# Altium footprint library 7-Connectors-11.PcbLib: 59 footprints (part 1 of 4)
Each footprint in its own frame and in the unit in brackets; x right, y up, seen from the top. Pads: shape width x height; smd on the part's side, far side on the other; paste and mask are expansions set on the pad; w line width, h text height; cw(c..) or ccw(c..) is an arc to the next point about the centre after c.
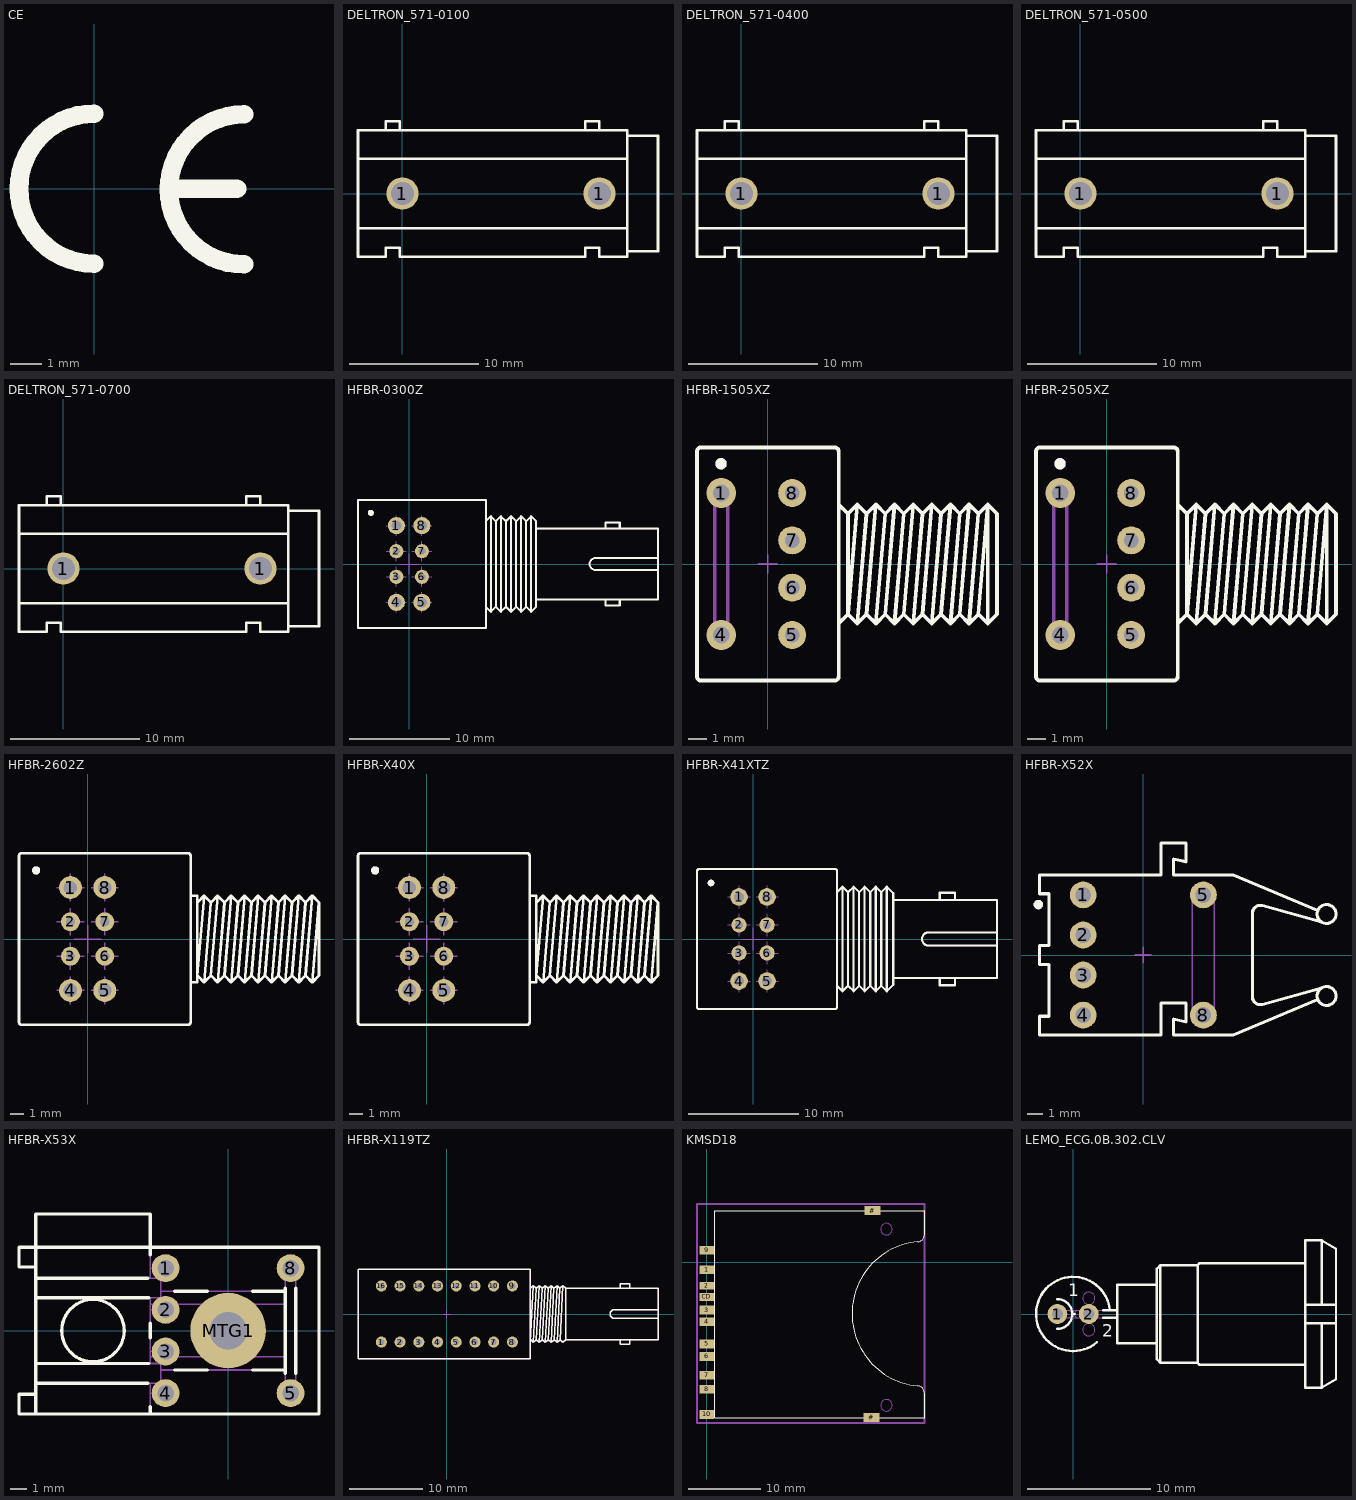
[diagram p0: the footprints below, top view; thin cyan lines are the x and y axes]

## CE [mm]
Top Overlay:
  lines w0.6: 0,-2.413 cw(c0,0) 0,2.413 ; 2.53,0 4.6,0 ; 4.826,-2.438 cw(c4.826,-0.025) 4.826,2.388
3D body "ce.stp": height 0.02, standoff 0, extent -2.725,-2.725 4.82,2.725

## DELTRON_571-0100 [mm] "Black Insulated ?4mm Angled Socket For Banana 4mm"
height 12.4
pads (2):
  round 2.5 hole 1.8: 1(0,0) 1(15.3,0)
Top Overlay:
  lines w0.2: -3.45,-2.7 17.45,-2.7 ; -3.45,2.7 17.45,2.7 ; -1.3,4.9 -1.3,5.6 -0.2,5.6 -0.2,4.9 ; 14.2,4.9 14.2,5.6 15.3,5.6 15.3,4.9 ; 17.45,-4.5 19.85,-4.5 19.85,4.5 17.45,4.5 ; -3.45,-4.9 -3.45,4.9 ; -3.45,-4.9 -1.3,-4.9 -1.3,-4.2 -0.2,-4.2 -0.2,-4.9 14.2,-4.9 14.2,-4.2 15.3,-4.2 15.3,-4.9 17.45,-4.9 17.45,4.9 -3.45,4.9 ; -3.45,-4.9 -3.45,4.9
Mechanical 8:
  lines w0.1: -0.5,0 0,0 ; 0,-0.5 0,0 ; 0,0.5 0,0 ; 0.5,0 0,0 ; 14.8,0 15.3,0 ; 15.3,-0.5 15.3,0 ; 15.3,0.5 15.3,0 ; 15.8,0 15.3,0
Mechanical 14:
  lines w0.1: -3.45,-2.7 17.45,-2.7 ; -3.45,2.7 17.45,2.7 ; -1.3,4.9 -1.3,5.6 -0.2,5.6 -0.2,4.9 ; 14.2,4.9 14.2,5.6 15.3,5.6 15.3,4.9 ; 17.45,-4.5 19.85,-4.5 19.85,4.5 17.45,4.5 ; -3.45,-4.9 -3.45,4.9 ; -3.45,-4.9 -1.3,-4.9 -1.3,-4.2 -0.2,-4.2 -0.2,-4.9 14.2,-4.9 14.2,-4.2 15.3,-4.2 15.3,-4.9 17.45,-4.9 17.45,4.9 -3.45,4.9 ; -3.45,-4.9 -3.45,4.9
3D body "DELTRON_571-0100.stp": height 12.4, standoff -3.8, extent -3.45,-4.9 19.85,5.6

## DELTRON_571-0400 [mm] "Green Insulated ?4mm Angled Socket For Banana 4mm"
height 12.4
pads (2):
  round 2.5 hole 1.8: 1(0,0) 1(15.3,0)
Top Overlay:
  lines w0.2: -3.45,-2.7 17.45,-2.7 ; -3.45,2.7 17.45,2.7 ; -1.3,4.9 -1.3,5.6 -0.2,5.6 -0.2,4.9 ; 14.2,4.9 14.2,5.6 15.3,5.6 15.3,4.9 ; 17.45,-4.5 19.85,-4.5 19.85,4.5 17.45,4.5 ; -3.45,-4.9 -3.45,4.9 ; -3.45,-4.9 -1.3,-4.9 -1.3,-4.2 -0.2,-4.2 -0.2,-4.9 14.2,-4.9 14.2,-4.2 15.3,-4.2 15.3,-4.9 17.45,-4.9 17.45,4.9 -3.45,4.9 ; -3.45,-4.9 -3.45,4.9
Mechanical 8:
  lines w0.1: -0.5,0 0,0 ; 0,-0.5 0,0 ; 0,0.5 0,0 ; 0.5,0 0,0 ; 14.8,0 15.3,0 ; 15.3,-0.5 15.3,0 ; 15.3,0.5 15.3,0 ; 15.8,0 15.3,0
Mechanical 14:
  lines w0.1: -3.45,-2.7 17.45,-2.7 ; -3.45,2.7 17.45,2.7 ; -1.3,4.9 -1.3,5.6 -0.2,5.6 -0.2,4.9 ; 14.2,4.9 14.2,5.6 15.3,5.6 15.3,4.9 ; 17.45,-4.5 19.85,-4.5 19.85,4.5 17.45,4.5 ; -3.45,-4.9 -3.45,4.9 ; -3.45,-4.9 -1.3,-4.9 -1.3,-4.2 -0.2,-4.2 -0.2,-4.9 14.2,-4.9 14.2,-4.2 15.3,-4.2 15.3,-4.9 17.45,-4.9 17.45,4.9 -3.45,4.9 ; -3.45,-4.9 -3.45,4.9
3D body "DELTRON_571-0400.stp": height 12.4, standoff -3.8, extent -3.45,-4.9 19.85,5.6

## DELTRON_571-0500 [mm] "Red Insulated ?4mm Angled Socket For Banana 4mm"
height 12.4
pads (2):
  round 2.5 hole 1.8: 1(0,0) 1(15.3,0)
Top Overlay:
  lines w0.2: -3.45,-2.7 17.45,-2.7 ; -3.45,2.7 17.45,2.7 ; -1.3,4.9 -1.3,5.6 -0.2,5.6 -0.2,4.9 ; 14.2,4.9 14.2,5.6 15.3,5.6 15.3,4.9 ; 17.45,-4.5 19.85,-4.5 19.85,4.5 17.45,4.5 ; -3.45,-4.9 -3.45,4.9 ; -3.45,-4.9 -1.3,-4.9 -1.3,-4.2 -0.2,-4.2 -0.2,-4.9 14.2,-4.9 14.2,-4.2 15.3,-4.2 15.3,-4.9 17.45,-4.9 17.45,4.9 -3.45,4.9 ; -3.45,-4.9 -3.45,4.9
Mechanical 8:
  lines w0.1: -0.5,0 0,0 ; 0,-0.5 0,0 ; 0,0.5 0,0 ; 0.5,0 0,0 ; 14.8,0 15.3,0 ; 15.3,-0.5 15.3,0 ; 15.3,0.5 15.3,0 ; 15.8,0 15.3,0
Mechanical 14:
  lines w0.1: -3.45,-2.7 17.45,-2.7 ; -3.45,2.7 17.45,2.7 ; -1.3,4.9 -1.3,5.6 -0.2,5.6 -0.2,4.9 ; 14.2,4.9 14.2,5.6 15.3,5.6 15.3,4.9 ; 17.45,-4.5 19.85,-4.5 19.85,4.5 17.45,4.5 ; -3.45,-4.9 -3.45,4.9 ; -3.45,-4.9 -1.3,-4.9 -1.3,-4.2 -0.2,-4.2 -0.2,-4.9 14.2,-4.9 14.2,-4.2 15.3,-4.2 15.3,-4.9 17.45,-4.9 17.45,4.9 -3.45,4.9 ; -3.45,-4.9 -3.45,4.9
3D body "DELTRON_571-0500.stp": height 12.4, standoff -3.8, extent -3.45,-4.9 19.85,5.6

## DELTRON_571-0700 [mm] "Yellow Insulated ?4mm Angled Socket For Banana 4mm"
height 12.4
pads (2):
  round 2.5 hole 1.8: 1(0,0) 1(15.3,0)
Top Overlay:
  lines w0.2: -3.45,-2.7 17.45,-2.7 ; -3.45,2.7 17.45,2.7 ; -1.3,4.9 -1.3,5.6 -0.2,5.6 -0.2,4.9 ; 14.2,4.9 14.2,5.6 15.3,5.6 15.3,4.9 ; 17.45,-4.5 19.85,-4.5 19.85,4.5 17.45,4.5 ; -3.45,-4.9 -3.45,4.9 ; -3.45,-4.9 -1.3,-4.9 -1.3,-4.2 -0.2,-4.2 -0.2,-4.9 14.2,-4.9 14.2,-4.2 15.3,-4.2 15.3,-4.9 17.45,-4.9 17.45,4.9 -3.45,4.9 ; -3.45,-4.9 -3.45,4.9
Mechanical 8:
  lines w0.1: -0.5,0 0,0 ; 0,-0.5 0,0 ; 0,0.5 0,0 ; 0.5,0 0,0 ; 14.8,0 15.3,0 ; 15.3,-0.5 15.3,0 ; 15.3,0.5 15.3,0 ; 15.8,0 15.3,0
Mechanical 14:
  lines w0.1: -3.45,-2.7 17.45,-2.7 ; -3.45,2.7 17.45,2.7 ; -1.3,4.9 -1.3,5.6 -0.2,5.6 -0.2,4.9 ; 14.2,4.9 14.2,5.6 15.3,5.6 15.3,4.9 ; 17.45,-4.5 19.85,-4.5 19.85,4.5 17.45,4.5 ; -3.45,-4.9 -3.45,4.9 ; -3.45,-4.9 -1.3,-4.9 -1.3,-4.2 -0.2,-4.2 -0.2,-4.9 14.2,-4.9 14.2,-4.2 15.3,-4.2 15.3,-4.9 17.45,-4.9 17.45,4.9 -3.45,4.9 ; -3.45,-4.9 -3.45,4.9
3D body "DELTRON_571-0700.stp": height 12.4, standoff -3.8, extent -3.45,-4.9 19.85,5.6

## HFBR-0300Z [mm] "HFBR-0300Z Series, Fiber Optic Transmitter or Receiver, Through Hole Mount"
height 10.2
pads (8):
  round 1.7 hole 1: 1(-1.27,3.81) 4(-1.27,-3.81) 5(1.27,-3.81) 8(1.27,3.81)
  round 1.4 hole 0.7: 2(-1.27,1.27) 3(-1.27,-1.27) 6(1.27,-1.27) 7(1.27,1.27)
Top Overlay:
  circle w0.3: c-3.81,5.08 r0.15
  lines w0.2: 7.62,-4.25 8.12,-4.75 ; 7.62,4.25 8.12,4.75 ; 12.62,-3.525 24.72,-3.525 ; 12.62,3.525 24.72,3.525 ; 19.52,-3.525 19.52,-4.1 20.92,-4.1 20.92,-3.525 ; 19.52,3.525 19.52,4.1 20.92,4.1 20.92,3.525 ; 24.72,-0.6 18.52,-0.6 cw(c18.52,0) 18.52,0.6 24.72,0.6 ; 8.12,-4.75 8.62,-4.25 ; 8.12,-4.75 8.12,4.75 ; 8.12,4.75 8.62,4.25 ; 8.62,-4.25 9.12,-4.75 ; 8.62,-4.25 8.62,4.25 ; 8.62,4.25 9.12,4.75 ; 9.12,-4.75 9.62,-4.25 ; 9.12,-4.75 9.12,4.75 ; 9.12,4.75 9.62,4.25 ; 9.62,-4.25 10.12,-4.75 ; 9.62,-4.25 9.62,4.25 ; 9.62,4.25 10.12,4.75 ; 10.12,-4.75 10.62,-4.25 ; 10.12,-4.75 10.12,4.75 ; 10.12,4.75 10.62,4.25 ; 10.62,-4.25 11.12,-4.75 ; 10.62,-4.25 10.62,4.25 ; 10.62,4.25 11.12,4.75 ; 11.12,-4.75 11.62,-4.25 ; 11.12,-4.75 11.12,4.75 ; 11.12,4.75 11.62,4.25 ; 11.62,-4.25 12.12,-4.75 ; 11.62,-4.25 11.62,4.25 ; 11.62,4.25 12.12,4.75 ; 12.12,-4.75 12.62,-4.25 12.62,4.25 12.12,4.75 ; 12.12,-4.75 12.12,4.75 ; 24.72,-3.525 24.72,3.525 ; 24.72,-3.525 24.72,3.525 ; -5.08,-6.35 -5.08,6.35 7.62,6.35 7.62,-6.35 -5.08,-6.35
Mechanical 8:
  lines w0.1: -2.27,-3.81 -1.27,-3.81 ; -2.27,-1.27 -1.27,-1.27 ; -2.27,1.27 -1.27,1.27 ; -2.27,3.81 -1.27,3.81 ; -1.27,-4.81 -1.27,-3.81 ; -1.27,-2.81 -1.27,-3.81 ; -1.27,-2.27 -1.27,-1.27 ; -1.27,-0.27 -1.27,-1.27 ; -1.27,0.27 -1.27,1.27 ; -1.27,2.27 -1.27,1.27 ; -1.27,2.81 -1.27,3.81 ; -1.27,4.81 -1.27,3.81 ; -1,0 0,0 ; -0.27,-3.81 -1.27,-3.81 ; -0.27,-1.27 -1.27,-1.27 ; -0.27,1.27 -1.27,1.27 ; -0.27,3.81 -1.27,3.81 ; 0,-1 0,0 ; 0,1 0,0 ; 0.27,-3.81 1.27,-3.81 ; 0.27,-1.27 1.27,-1.27 ; 0.27,1.27 1.27,1.27 ; 0.27,3.81 1.27,3.81 ; 1,0 0,0 ; 1.27,-4.81 1.27,-3.81 ; 1.27,-2.81 1.27,-3.81 ; 1.27,-2.27 1.27,-1.27 ; 1.27,-0.27 1.27,-1.27 ; 1.27,0.27 1.27,1.27 ; 1.27,2.27 1.27,1.27 ; 1.27,2.81 1.27,3.81 ; 1.27,4.81 1.27,3.81 ; 2.27,-3.81 1.27,-3.81 ; 2.27,-1.27 1.27,-1.27 ; 2.27,1.27 1.27,1.27 ; 2.27,3.81 1.27,3.81
Mechanical 14:
  circle w0.3: c-3.81,5.08 r0.15
  lines w0.1: 7.62,-4.25 8.12,-4.75 ; 7.62,4.25 8.12,4.75 ; 12.62,-3.525 24.72,-3.525 24.72,3.525 12.62,3.525 ; 19.52,-3.525 19.52,-4.1 20.92,-4.1 20.92,-3.525 ; 19.52,3.525 19.52,4.1 20.92,4.1 20.92,3.525 ; 24.72,-0.6 18.52,-0.6 cw(c18.52,0) 18.52,0.6 24.72,0.6 ; 8.12,-4.75 8.62,-4.25 ; 8.12,-4.75 8.12,4.75 ; 8.12,4.75 8.62,4.25 ; 8.62,-4.25 9.12,-4.75 ; 8.62,-4.25 8.62,4.25 ; 8.62,4.25 9.12,4.75 ; 9.12,-4.75 9.62,-4.25 ; 9.12,-4.75 9.12,4.75 ; 9.12,4.75 9.62,4.25 ; 9.62,-4.25 10.12,-4.75 ; 9.62,-4.25 9.62,4.25 ; 9.62,4.25 10.12,4.75 ; 10.12,-4.75 10.62,-4.25 ; 10.12,-4.75 10.12,4.75 ; 10.12,4.75 10.62,4.25 ; 10.62,-4.25 11.12,-4.75 ; 10.62,-4.25 10.62,4.25 ; 10.62,4.25 11.12,4.75 ; 11.12,-4.75 11.62,-4.25 ; 11.12,-4.75 11.12,4.75 ; 11.12,4.75 11.62,4.25 ; 11.62,-4.25 12.12,-4.75 ; 11.62,-4.25 11.62,4.25 ; 11.62,4.25 12.12,4.75 ; 12.12,-4.75 12.62,-4.25 12.62,4.25 12.12,4.75 ; 12.12,-4.75 12.12,4.75 ; -5.08,-6.15 ccw(c-4.88,-6.15) -4.88,-6.35 7.42,-6.35 ccw(c7.42,-6.15) 7.62,-6.15 7.62,6.15 ccw(c7.42,6.15) 7.42,6.35 -4.88,6.35 ccw(c-4.88,6.15) -5.08,6.15 -5.08,-6.15
3D body "HFBR-0300Z.stp": height 10.2, standoff -3.6, extent -5.08,-6.35 24.72,6.35

## HFBR-1505XZ [mm] "HFBR-1505xZ Series, SMA Plastic Housed, Fiber Optic Transmitter"
height 10.2
pads (6):
  round 1.6 hole 0.9: 1(-2.5,3.81) 4(-2.5,-3.81)
  round 1.5 hole 0.8: 5(1.31,-3.81) 6(1.31,-1.27) 7(1.31,1.27) 8(1.31,3.81)
Top Overlay:
  circle w0.3: c-2.51,5.38 r0.15
  lines w0.2: 3.8,-3.2 4.3,-2.7 ; 3.8,3.2 4.3,2.7 ; 4.3,-2.7 4.3,2.7 ; 4.3,-2.7 4.8,-3.2 ; 4.3,-2.7 4.8,3.2 ; 4.3,2.7 4.8,3.2 ; 4.8,-3.2 5.3,-2.7 ; 4.8,-3.2 5.3,2.7 ; 4.8,3.2 5.3,2.7 ; 5.3,-2.7 5.8,-3.2 ; 5.3,-2.7 5.8,3.2 ; 5.3,2.7 5.8,3.2 ; 5.8,-3.2 6.3,-2.7 ; 5.8,-3.2 6.3,2.7 ; 5.8,3.2 6.3,2.7 ; 6.3,-2.7 6.8,-3.2 ; 6.3,-2.7 6.8,3.2 ; 6.3,2.7 6.8,3.2 ; 6.8,-3.2 7.3,-2.7 ; 6.8,-3.2 7.3,2.7 ; 6.8,3.2 7.3,2.7 ; 7.3,-2.7 7.8,-3.2 ; 7.3,-2.7 7.8,3.2 ; 7.3,2.7 7.8,3.2 ; 7.8,-3.2 8.3,-2.7 ; 7.8,-3.2 8.3,2.7 ; 7.8,3.2 8.3,2.7 ; 8.3,-2.7 8.8,-3.2 ; 8.3,-2.7 8.8,3.2 ; 8.3,2.7 8.8,3.2 ; 8.8,-3.2 9.3,-2.7 ; 8.8,-3.2 9.3,2.7 ; 8.8,3.2 9.3,2.7 ; 9.3,-2.7 9.8,-3.2 ; 9.3,-2.7 9.8,3.2 ; 9.3,2.7 9.8,3.2 ; 9.8,-3.2 10.3,-2.7 ; 9.8,-3.2 10.3,2.7 ; 9.8,3.2 10.3,2.7 ; 10.3,-2.7 10.8,-3.2 ; 10.3,-2.7 10.8,3.2 ; 10.3,2.7 10.8,3.2 ; 10.8,-3.2 11.3,-2.7 ; 10.8,-3.2 11.3,2.7 ; 10.8,3.2 11.3,2.7 ; 11.3,-2.7 11.8,-3.2 ; 11.3,-2.7 11.8,3.2 ; 11.3,2.7 11.8,3.2 ; 11.8,-3.2 12.3,-2.7 12.3,2.7 11.8,3.2 ; 11.8,-3.2 11.8,3.2 ; -3.8,-6.05 ccw(c-3.6,-6.05) -3.6,-6.25 3.6,-6.25 ccw(c3.6,-6.05) 3.8,-6.05 3.8,6.05 ccw(c3.6,6.05) 3.6,6.25 -3.6,6.25 ccw(c-3.6,6.05) -3.8,6.05 -3.8,-6.05
Mechanical 8:
  lines w0.1: -3,-3.81 -2.5,-3.81 ; -3,3.81 -2.5,3.81 ; -2.5,-4.31 -2.5,-3.81 ; -2.5,-3.31 -2.5,-3.81 ; -2.5,3.31 -2.5,3.81 ; -2.5,4.31 -2.5,3.81 ; -2,-3.81 -2.5,-3.81 ; -2,3.81 -2.5,3.81 ; -0.5,0 0,0 ; 0,-0.5 0,0 ; 0,0.5 0,0 ; 0.5,0 0,0 ; 0.81,-3.81 1.31,-3.81 ; 0.81,-1.27 1.31,-1.27 ; 0.81,1.27 1.31,1.27 ; 0.81,3.81 1.31,3.81 ; 1.31,-4.31 1.31,-3.81 ; 1.31,-3.31 1.31,-3.81 ; 1.31,-1.77 1.31,-1.27 ; 1.31,-0.77 1.31,-1.27 ; 1.31,0.77 1.31,1.27 ; 1.31,1.77 1.31,1.27 ; 1.31,3.31 1.31,3.81 ; 1.31,4.31 1.31,3.81 ; 1.81,-3.81 1.31,-3.81 ; 1.81,-1.27 1.31,-1.27 ; 1.81,1.27 1.31,1.27 ; 1.81,3.81 1.31,3.81
Mechanical 14:
  circle w0.3: c-2.51,5.38 r0.15
  lines w0.1: 3.8,-3.2 4.3,-2.7 ; 3.8,3.2 4.3,2.7 ; 4.3,-2.7 4.3,2.7 ; 4.3,-2.7 4.8,-3.2 ; 4.3,-2.7 4.8,3.2 ; 4.3,2.7 4.8,3.2 ; 4.8,-3.2 5.3,-2.7 ; 4.8,-3.2 5.3,2.7 ; 4.8,3.2 5.3,2.7 ; 5.3,-2.7 5.8,-3.2 ; 5.3,-2.7 5.8,3.2 ; 5.3,2.7 5.8,3.2 ; 5.8,-3.2 6.3,-2.7 ; 5.8,-3.2 6.3,2.7 ; 5.8,3.2 6.3,2.7 ; 6.3,-2.7 6.8,-3.2 ; 6.3,-2.7 6.8,3.2 ; 6.3,2.7 6.8,3.2 ; 6.8,-3.2 7.3,-2.7 ; 6.8,-3.2 7.3,2.7 ; 6.8,3.2 7.3,2.7 ; 7.3,-2.7 7.8,-3.2 ; 7.3,-2.7 7.8,3.2 ; 7.3,2.7 7.8,3.2 ; 7.8,-3.2 8.3,-2.7 ; 7.8,-3.2 8.3,2.7 ; 7.8,3.2 8.3,2.7 ; 8.3,-2.7 8.8,-3.2 ; 8.3,-2.7 8.8,3.2 ; 8.3,2.7 8.8,3.2 ; 8.8,-3.2 9.3,-2.7 ; 8.8,-3.2 9.3,2.7 ; 8.8,3.2 9.3,2.7 ; 9.3,-2.7 9.8,-3.2 ; 9.3,-2.7 9.8,3.2 ; 9.3,2.7 9.8,3.2 ; 9.8,-3.2 10.3,-2.7 ; 9.8,-3.2 10.3,2.7 ; 9.8,3.2 10.3,2.7 ; 10.3,-2.7 10.8,-3.2 ; 10.3,-2.7 10.8,3.2 ; 10.3,2.7 10.8,3.2 ; 10.8,-3.2 11.3,-2.7 ; 10.8,-3.2 11.3,2.7 ; 10.8,3.2 11.3,2.7 ; 11.3,-2.7 11.8,-3.2 ; 11.3,-2.7 11.8,3.2 ; 11.3,2.7 11.8,3.2 ; 11.8,-3.2 12.3,-2.7 12.3,2.7 11.8,3.2 ; 11.8,-3.2 11.8,3.2 ; -3.8,-6.05 ccw(c-3.6,-6.05) -3.6,-6.25 3.6,-6.25 ccw(c3.6,-6.05) 3.8,-6.05 3.8,6.05 ccw(c3.6,6.05) 3.6,6.25 -3.6,6.25 ccw(c-3.6,6.05) -3.8,6.05 -3.8,-6.05 ; -2.9,-4.25 -2.9,4.25 -2.1,4.25 -2.1,-4.25 -2.9,-4.25 ; -2.8,-3.81 ccw(c-2.5,-3.81) -2.2,-3.81 -2.2,3.81 ccw(c-2.5,3.81) -2.8,3.81 -2.8,-3.81
3D body "HFBR-1505xZ.stp": height 10.2, standoff -2.8, extent -3.8,-6.249 12.3,6.249

## HFBR-2505XZ [mm] "HFBR-2505xZ Series, SMA Plastic Housed, Fiber Optic Receiver"
height 10.2
pads (6):
  round 1.6 hole 0.9: 1(-2.5,3.81) 4(-2.5,-3.81)
  round 1.5 hole 0.8: 5(1.31,-3.81) 6(1.31,-1.27) 7(1.31,1.27) 8(1.31,3.81)
Top Overlay:
  circle w0.3: c-2.51,5.38 r0.15
  lines w0.2: 3.8,-3.2 4.3,-2.7 ; 3.8,3.2 4.3,2.7 ; 4.3,-2.7 4.3,2.7 ; 4.3,-2.7 4.8,-3.2 ; 4.3,-2.7 4.8,3.2 ; 4.3,2.7 4.8,3.2 ; 4.8,-3.2 5.3,-2.7 ; 4.8,-3.2 5.3,2.7 ; 4.8,3.2 5.3,2.7 ; 5.3,-2.7 5.8,-3.2 ; 5.3,-2.7 5.8,3.2 ; 5.3,2.7 5.8,3.2 ; 5.8,-3.2 6.3,-2.7 ; 5.8,-3.2 6.3,2.7 ; 5.8,3.2 6.3,2.7 ; 6.3,-2.7 6.8,-3.2 ; 6.3,-2.7 6.8,3.2 ; 6.3,2.7 6.8,3.2 ; 6.8,-3.2 7.3,-2.7 ; 6.8,-3.2 7.3,2.7 ; 6.8,3.2 7.3,2.7 ; 7.3,-2.7 7.8,-3.2 ; 7.3,-2.7 7.8,3.2 ; 7.3,2.7 7.8,3.2 ; 7.8,-3.2 8.3,-2.7 ; 7.8,-3.2 8.3,2.7 ; 7.8,3.2 8.3,2.7 ; 8.3,-2.7 8.8,-3.2 ; 8.3,-2.7 8.8,3.2 ; 8.3,2.7 8.8,3.2 ; 8.8,-3.2 9.3,-2.7 ; 8.8,-3.2 9.3,2.7 ; 8.8,3.2 9.3,2.7 ; 9.3,-2.7 9.8,-3.2 ; 9.3,-2.7 9.8,3.2 ; 9.3,2.7 9.8,3.2 ; 9.8,-3.2 10.3,-2.7 ; 9.8,-3.2 10.3,2.7 ; 9.8,3.2 10.3,2.7 ; 10.3,-2.7 10.8,-3.2 ; 10.3,-2.7 10.8,3.2 ; 10.3,2.7 10.8,3.2 ; 10.8,-3.2 11.3,-2.7 ; 10.8,-3.2 11.3,2.7 ; 10.8,3.2 11.3,2.7 ; 11.3,-2.7 11.8,-3.2 ; 11.3,-2.7 11.8,3.2 ; 11.3,2.7 11.8,3.2 ; 11.8,-3.2 12.3,-2.7 12.3,2.7 11.8,3.2 ; 11.8,-3.2 11.8,3.2 ; -3.8,-6.05 ccw(c-3.6,-6.05) -3.6,-6.25 3.6,-6.25 ccw(c3.6,-6.05) 3.8,-6.05 3.8,6.05 ccw(c3.6,6.05) 3.6,6.25 -3.6,6.25 ccw(c-3.6,6.05) -3.8,6.05 -3.8,-6.05
Mechanical 8:
  lines w0.1: -3,-3.81 -2.5,-3.81 ; -3,3.81 -2.5,3.81 ; -2.5,-4.31 -2.5,-3.81 ; -2.5,-3.31 -2.5,-3.81 ; -2.5,3.31 -2.5,3.81 ; -2.5,4.31 -2.5,3.81 ; -2,-3.81 -2.5,-3.81 ; -2,3.81 -2.5,3.81 ; -0.5,0 0,0 ; 0,-0.5 0,0 ; 0,0.5 0,0 ; 0.5,0 0,0 ; 0.81,-3.81 1.31,-3.81 ; 0.81,-1.27 1.31,-1.27 ; 0.81,1.27 1.31,1.27 ; 0.81,3.81 1.31,3.81 ; 1.31,-4.31 1.31,-3.81 ; 1.31,-3.31 1.31,-3.81 ; 1.31,-1.77 1.31,-1.27 ; 1.31,-0.77 1.31,-1.27 ; 1.31,0.77 1.31,1.27 ; 1.31,1.77 1.31,1.27 ; 1.31,3.31 1.31,3.81 ; 1.31,4.31 1.31,3.81 ; 1.81,-3.81 1.31,-3.81 ; 1.81,-1.27 1.31,-1.27 ; 1.81,1.27 1.31,1.27 ; 1.81,3.81 1.31,3.81
Mechanical 14:
  circle w0.3: c-2.51,5.38 r0.15
  lines w0.1: 3.8,-3.2 4.3,-2.7 ; 3.8,3.2 4.3,2.7 ; 4.3,-2.7 4.3,2.7 ; 4.3,-2.7 4.8,-3.2 ; 4.3,-2.7 4.8,3.2 ; 4.3,2.7 4.8,3.2 ; 4.8,-3.2 5.3,-2.7 ; 4.8,-3.2 5.3,2.7 ; 4.8,3.2 5.3,2.7 ; 5.3,-2.7 5.8,-3.2 ; 5.3,-2.7 5.8,3.2 ; 5.3,2.7 5.8,3.2 ; 5.8,-3.2 6.3,-2.7 ; 5.8,-3.2 6.3,2.7 ; 5.8,3.2 6.3,2.7 ; 6.3,-2.7 6.8,-3.2 ; 6.3,-2.7 6.8,3.2 ; 6.3,2.7 6.8,3.2 ; 6.8,-3.2 7.3,-2.7 ; 6.8,-3.2 7.3,2.7 ; 6.8,3.2 7.3,2.7 ; 7.3,-2.7 7.8,-3.2 ; 7.3,-2.7 7.8,3.2 ; 7.3,2.7 7.8,3.2 ; 7.8,-3.2 8.3,-2.7 ; 7.8,-3.2 8.3,2.7 ; 7.8,3.2 8.3,2.7 ; 8.3,-2.7 8.8,-3.2 ; 8.3,-2.7 8.8,3.2 ; 8.3,2.7 8.8,3.2 ; 8.8,-3.2 9.3,-2.7 ; 8.8,-3.2 9.3,2.7 ; 8.8,3.2 9.3,2.7 ; 9.3,-2.7 9.8,-3.2 ; 9.3,-2.7 9.8,3.2 ; 9.3,2.7 9.8,3.2 ; 9.8,-3.2 10.3,-2.7 ; 9.8,-3.2 10.3,2.7 ; 9.8,3.2 10.3,2.7 ; 10.3,-2.7 10.8,-3.2 ; 10.3,-2.7 10.8,3.2 ; 10.3,2.7 10.8,3.2 ; 10.8,-3.2 11.3,-2.7 ; 10.8,-3.2 11.3,2.7 ; 10.8,3.2 11.3,2.7 ; 11.3,-2.7 11.8,-3.2 ; 11.3,-2.7 11.8,3.2 ; 11.3,2.7 11.8,3.2 ; 11.8,-3.2 12.3,-2.7 12.3,2.7 11.8,3.2 ; 11.8,-3.2 11.8,3.2 ; -3.8,-6.05 ccw(c-3.6,-6.05) -3.6,-6.25 3.6,-6.25 ccw(c3.6,-6.05) 3.8,-6.05 3.8,6.05 ccw(c3.6,6.05) 3.6,6.25 -3.6,6.25 ccw(c-3.6,6.05) -3.8,6.05 -3.8,-6.05 ; -2.9,-4.25 -2.9,4.25 -2.1,4.25 -2.1,-4.25 -2.9,-4.25 ; -2.8,-3.81 ccw(c-2.5,-3.81) -2.2,-3.81 -2.2,3.81 ccw(c-2.5,3.81) -2.8,3.81 -2.8,-3.81
3D body "HFBR-2505xZ.stp": height 10.2, standoff -2.8, extent -3.8,-6.249 12.3,6.249

## HFBR-2602Z [mm] "HFBR-2602Z Series, Fiber Optic Receiver, Through Hole Mount"
height 10.2
pads (8):
  round 1.7 hole 1: 1(-1.27,3.81) 4(-1.27,-3.81) 5(1.27,-3.81) 8(1.27,3.81)
  round 1.4 hole 0.7: 2(-1.27,1.27) 3(-1.27,-1.27) 6(1.27,-1.27) 7(1.27,1.27)
Top Overlay:
  circle w0.3: c-3.81,5.08 r0.15
  lines w0.2: 7.62,-3.2 8.12,-3.2 8.12,3.2 7.62,3.2 ; 8.12,2.7 8.62,3.2 ; 8.62,-3.2 9.12,2.7 ; 8.62,-3.2 8.12,-2.7 8.62,3.2 ; 8.62,-3.2 9.12,-2.7 ; 8.62,3.2 9.12,2.7 ; 9.12,-2.7 9.62,3.2 ; 9.12,-2.7 9.62,-3.2 ; 9.12,2.7 9.62,3.2 ; 9.62,-3.2 10.12,2.7 ; 9.62,-3.2 10.12,-2.7 ; 9.62,3.2 10.12,2.7 ; 10.12,-2.7 10.62,3.2 ; 10.12,-2.7 10.62,-3.2 ; 10.12,2.7 10.62,3.2 ; 10.62,-3.2 11.12,2.7 ; 10.62,-3.2 11.12,-2.7 ; 10.62,3.2 11.12,2.7 ; 11.12,-2.7 11.62,3.2 ; 11.12,-2.7 11.62,-3.2 ; 11.12,2.7 11.62,3.2 ; 11.62,-3.2 12.12,2.7 ; 11.62,-3.2 12.12,-2.7 ; 11.62,3.2 12.12,2.7 ; 12.12,-2.7 12.62,3.2 ; 12.12,-2.7 12.62,-3.2 ; 12.12,2.7 12.62,3.2 ; 12.62,-3.2 13.12,2.7 ; 12.62,-3.2 13.12,-2.7 ; 12.62,3.2 13.12,2.7 ; 13.12,-2.7 13.62,3.2 ; 13.12,-2.7 13.62,-3.2 ; 13.12,2.7 13.62,3.2 ; 13.62,-3.2 14.12,2.7 ; 13.62,-3.2 14.12,-2.7 ; 13.62,3.2 14.12,2.7 ; 14.12,-2.7 14.62,3.2 ; 14.12,-2.7 14.62,-3.2 ; 14.12,2.7 14.62,3.2 ; 14.62,-3.2 15.12,2.7 ; 14.62,-3.2 15.12,-2.7 ; 14.62,3.2 15.12,2.7 ; 15.12,-2.7 15.62,3.2 ; 15.12,-2.7 15.62,-3.2 ; 15.12,2.7 15.62,3.2 ; 15.62,-3.2 16.12,2.7 ; 15.62,-3.2 16.12,-2.7 ; 15.62,3.2 16.12,2.7 ; 16.12,-2.7 16.62,3.2 ; 16.12,-2.7 16.62,-3.2 ; 16.12,2.7 16.62,3.2 ; 16.62,-3.2 17.12,2.7 ; 16.62,-3.2 17.12,-2.7 17.12,2.7 ; 16.62,3.2 17.12,2.7 ; -5.08,-6.15 ccw(c-4.88,-6.15) -4.88,-6.35 7.42,-6.35 ccw(c7.42,-6.15) 7.62,-6.15 7.62,6.15 ccw(c7.42,6.15) 7.42,6.35 -4.88,6.35 ccw(c-4.88,6.15) -5.08,6.15 -5.08,-6.15
Mechanical 8:
  lines w0.1: -2.27,-3.81 -1.27,-3.81 ; -2.27,-1.27 -1.27,-1.27 ; -2.27,1.27 -1.27,1.27 ; -2.27,3.81 -1.27,3.81 ; -1.27,-4.81 -1.27,-3.81 ; -1.27,-2.81 -1.27,-3.81 ; -1.27,-2.27 -1.27,-1.27 ; -1.27,-0.27 -1.27,-1.27 ; -1.27,0.27 -1.27,1.27 ; -1.27,2.27 -1.27,1.27 ; -1.27,2.81 -1.27,3.81 ; -1.27,4.81 -1.27,3.81 ; -1,0 0,0 ; -0.27,-3.81 -1.27,-3.81 ; -0.27,-1.27 -1.27,-1.27 ; -0.27,1.27 -1.27,1.27 ; -0.27,3.81 -1.27,3.81 ; 0,-1 0,0 ; 0,1 0,0 ; 0.27,-3.81 1.27,-3.81 ; 0.27,-1.27 1.27,-1.27 ; 0.27,1.27 1.27,1.27 ; 0.27,3.81 1.27,3.81 ; 1,0 0,0 ; 1.27,-4.81 1.27,-3.81 ; 1.27,-2.81 1.27,-3.81 ; 1.27,-2.27 1.27,-1.27 ; 1.27,-0.27 1.27,-1.27 ; 1.27,0.27 1.27,1.27 ; 1.27,2.27 1.27,1.27 ; 1.27,2.81 1.27,3.81 ; 1.27,4.81 1.27,3.81 ; 2.27,-3.81 1.27,-3.81 ; 2.27,-1.27 1.27,-1.27 ; 2.27,1.27 1.27,1.27 ; 2.27,3.81 1.27,3.81
Mechanical 14:
  circle w0.3: c-3.81,5.08 r0.15
  lines w0.1: 7.62,-3.2 8.12,-3.2 8.12,3.2 7.62,3.2 ; 8.12,2.7 8.62,3.2 ; 8.62,-3.2 9.12,2.7 ; 8.62,-3.2 8.12,-2.7 8.62,3.2 ; 8.62,-3.2 9.12,-2.7 ; 8.62,3.2 9.12,2.7 ; 9.12,-2.7 9.62,3.2 ; 9.12,-2.7 9.62,-3.2 ; 9.12,2.7 9.62,3.2 ; 9.62,-3.2 10.12,2.7 ; 9.62,-3.2 10.12,-2.7 ; 9.62,3.2 10.12,2.7 ; 10.12,-2.7 10.62,3.2 ; 10.12,-2.7 10.62,-3.2 ; 10.12,2.7 10.62,3.2 ; 10.62,-3.2 11.12,2.7 ; 10.62,-3.2 11.12,-2.7 ; 10.62,3.2 11.12,2.7 ; 11.12,-2.7 11.62,3.2 ; 11.12,-2.7 11.62,-3.2 ; 11.12,2.7 11.62,3.2 ; 11.62,-3.2 12.12,2.7 ; 11.62,-3.2 12.12,-2.7 ; 11.62,3.2 12.12,2.7 ; 12.12,-2.7 12.62,3.2 ; 12.12,-2.7 12.62,-3.2 ; 12.12,2.7 12.62,3.2 ; 12.62,-3.2 13.12,2.7 ; 12.62,-3.2 13.12,-2.7 ; 12.62,3.2 13.12,2.7 ; 13.12,-2.7 13.62,3.2 ; 13.12,-2.7 13.62,-3.2 ; 13.12,2.7 13.62,3.2 ; 13.62,-3.2 14.12,2.7 ; 13.62,-3.2 14.12,-2.7 ; 13.62,3.2 14.12,2.7 ; 14.12,-2.7 14.62,3.2 ; 14.12,-2.7 14.62,-3.2 ; 14.12,2.7 14.62,3.2 ; 14.62,-3.2 15.12,2.7 ; 14.62,-3.2 15.12,-2.7 ; 14.62,3.2 15.12,2.7 ; 15.12,-2.7 15.62,3.2 ; 15.12,-2.7 15.62,-3.2 ; 15.12,2.7 15.62,3.2 ; 15.62,-3.2 16.12,2.7 ; 15.62,-3.2 16.12,-2.7 ; 15.62,3.2 16.12,2.7 ; 16.12,-2.7 16.62,3.2 ; 16.12,-2.7 16.62,-3.2 ; 16.12,2.7 16.62,3.2 ; 16.62,-3.2 17.12,2.7 ; 16.62,-3.2 17.12,-2.7 17.12,2.7 ; 16.62,3.2 17.12,2.7 ; -5.08,-6.15 ccw(c-4.88,-6.15) -4.88,-6.35 7.42,-6.35 ccw(c7.42,-6.15) 7.62,-6.15 7.62,6.15 ccw(c7.42,6.15) 7.42,6.35 -4.88,6.35 ccw(c-4.88,6.15) -5.08,6.15 -5.08,-6.15